# Altium footprint library General.PCBLIB: 226 footprints (part 12 of 15)
Each footprint in its own frame and in the unit in brackets; x right, y up, seen from the top. Pads: shape width x height; smd on the part's side, far side on the other; paste and mask are expansions set on the pad; w line width, h text height; cw(c..) or ccw(c..) is an arc to the next point about the centre after c.
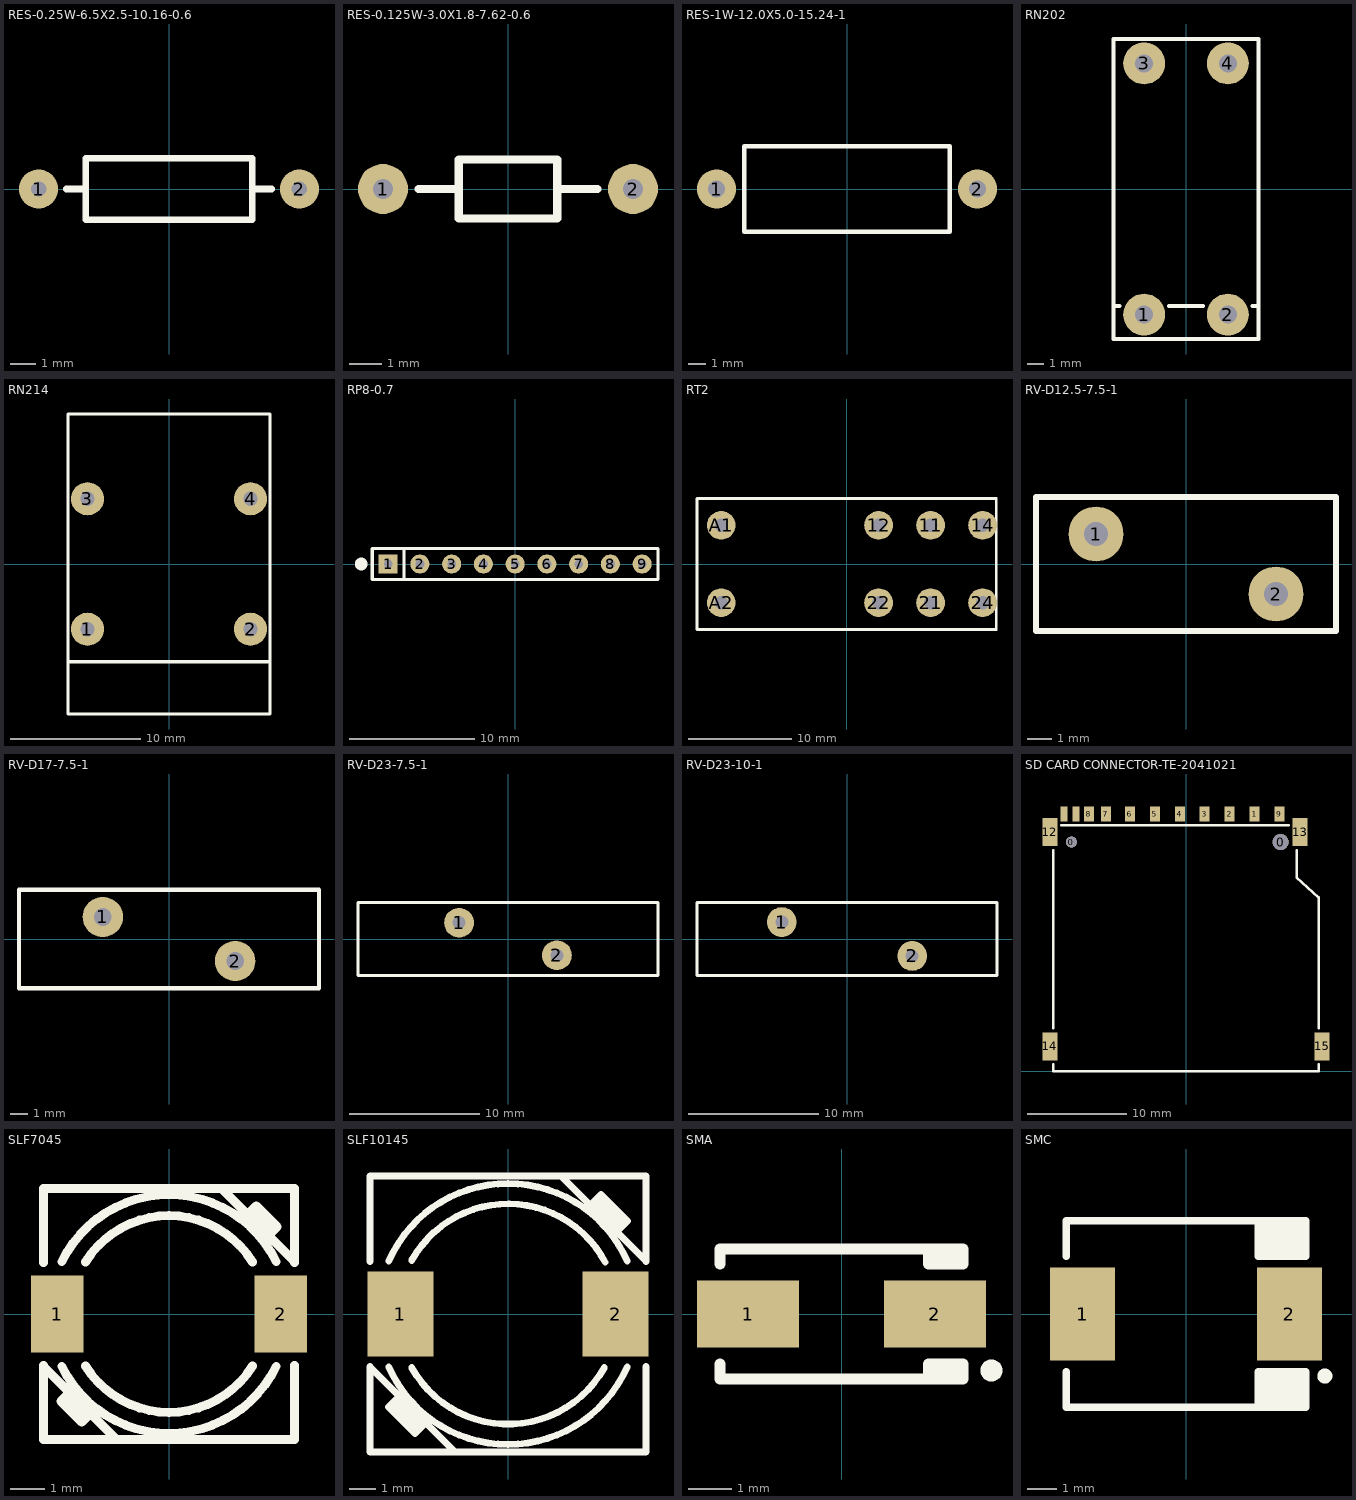
[diagram p11: the footprints below, top view; thin cyan lines are the x and y axes]

## RES-0.25W-6.5X2.5-10.16-0.6 [mil] "Resistor, 0.25W"
height 94.49
pads (2):
  round 60 hole 23.62: 1(-200,0) 2(200,0)
Top Overlay:
  lines w10: -157.48,0 -127.95,0 ; 127.95,0 157.48,0 ; -127.95,-47.24 -127.95,47.24 127.95,47.24 127.95,-47.24 -127.95,-47.24
3D body: height 91.88, standoff -123.62, extent -212.01,-45.47 211.99,45.53

## RES-0.125W-3.0X1.8-7.62-0.6 [mil] "Resistor, 0.125W"
height 70.87
pads (2):
  round 60 hole 23.62: 1(-150,0) 2(150,0)
Top Overlay:
  lines w10: -107.48,0 -59.06,0 ; 59.06,0 107.48,0 ; -59.06,-35.43 59.06,-35.43 59.06,35.43 -59.06,35.43 -59.06,-35.43
3D body: height 71.65, standoff -160.63, extent -157.87,-35.43 157.09,35.43

## RES-1W-12.0X5.0-15.24-1 [mil] "Resistor, 1W"
height 196.85
pads (2):
  round 90 hole 39.37: 1(-300,0) 2(300,0)
Top Overlay:
  lines w10: -236.22,-98.43 236.22,-98.43 236.22,98.43 -236.22,98.43 -236.22,-98.43
3D body: height 196.85, standoff -118.11, extent -313.78,-98.43 313.78,98.43

## RN202 [mm] "SCHAFFNER Chock"
height 13.5
pads (4):
  round 2.54 hole 1.1: 1(-2.54,-7.62) 2(2.54,-7.62) 3(-2.54,7.62) 4(2.54,7.62)
Top Overlay:
  lines w0.254: -4.4,-7.1 -4.04,-7.1 ; -1.04,-7.1 1.04,-7.1 ; 4.04,-7.1 4.4,-7.1 ; -4.4,-9.1 -4.4,9.1 4.4,9.1 4.4,-9.1 -4.4,-9.1
3D body: height 23.81, standoff 0, extent -4.4,-9.1 4.4,9.1

## RN214 [mm] "SCHAFFNER Chock"
height 25
pads (4):
  round 2.54 hole 1.1: 1(-6.25,-5) 2(6.25,-5) 3(-6.25,5) 4(6.25,5)
Top Overlay:
  lines w0.254: -7.75,-7.5 7.75,-7.5 ; -7.75,-11.5 7.75,-11.5 7.75,11.5 -7.75,11.5 -7.75,-11.5
3D body: height 25, standoff 0, extent -7.75,-11.5 7.75,11.5

## RP8-0.7 [mil] "Resistor Pack 8"
height 236.22
pads (9):
  rect 60x60 hole 27.56: 1(-400,0)
  round 60 hole 27.56: 2(-300,0) 3(-200,0) 4(-100,0) 5(0,0) 6(100,0) 7(200,0) 8(300,0) 9(400,0)
Top Overlay:
  circle w20: c-485,0 r10
  lines w10: -350,-49.21 -350,49.21 ; -450,-49.21 -450,49.21 450,49.21 450,-49.21 -450,-49.21
3D body: height 198.82, standoff -135.83, extent -442.91,-24.61 442.91,24.61

## RT2 [mm] "Relay, TE"
height 16.2
pads (8):
  round 2.794 hole 1.3: 11(8.15,3.75) 12(3.11,3.75) 14(13.19,3.75) 21(8.15,-3.75) 22(3.11,-3.75) 24(13.19,-3.75) A1(-12.15,3.75) A2(-12.15,-3.75)
Top Overlay:
  lines w0.254: -14.5,-6.35 14.5,-6.35 14.5,6.35 -14.5,6.35 -14.5,-6.35
3D body: height 15.5, standoff -4, extent -14.5,-6.25 14.5,6.25

## RV-D12.5-7.5-1 [mm] "Varistor, 10mm"
height 16
pads (2):
  round 2.286 hole 1: 1(-3.75,1.25) 2(3.75,-1.25)
Top Overlay:
  lines w0.254: -6.25,-2.8 -6.25,2.8 6.25,2.8 6.25,-2.8 -6.25,-2.8
3D body: height 16, standoff -3, extent -6.25,-2.8 6.25,2.8

## RV-D17-7.5-1 [mm] "Varistor, 14mm"
height 20
pads (2):
  round 2.286 hole 1: 1(-3.75,1.25) 2(3.75,-1.25)
Top Overlay:
  lines w0.254: -8.5,-2.8 8.5,-2.8 8.5,2.8 -8.5,2.8 -8.5,-2.8
3D body: height 20, standoff -3, extent -8.5,-2.8 8.499,2.8

## RV-D23-7.5-1 [mm] "Varistor, 20mm"
height 26.5
pads (2):
  round 2.286 hole 1: 1(-3.75,1.25) 2(3.75,-1.25)
Top Overlay:
  lines w0.254: -11.5,-2.8 -11.5,2.8 11.5,2.8 11.5,-2.8 -11.5,-2.8
3D body: height 26.5, standoff -3, extent -11.5,-2.8 11.5,2.8

## RV-D23-10-1 [mm] "Varistor, 20mm"
height 26.5
pads (2):
  round 2.286 hole 1: 1(-5,1.3) 2(5,-1.3)
Top Overlay:
  lines w0.254: -11.5,-2.8 11.5,-2.8 11.5,2.8 -11.5,2.8 -11.5,-2.8
3D body: height 24.7, standoff -2.79, extent -10.756,-2.898 10.744,2.9

## SD CARD CONNECTOR-TE-2041021 [mm] "SD Card Connector, TE, 2041021"
height 3.3
pads (17):
  round 1.1 hole 1.1 unplated: 0(-11.5,23)
  round 1.6 hole 1.6 unplated: 0(9.5,23)
  rect 1x1.5 smd: 1(6.875,25.8) 2(4.375,25.8) 3(1.875,25.8) 4(-0.625,25.8) 5(-3.125,25.8) 6(-5.625,25.8) 7(-8.05,25.8) 8(-9.75,25.8) 9(9.375,25.8)
  rect 0.7x1.5 smd: 10(-11.05,25.8) 11(-12.25,25.8)
  rect 1.5x2.8 smd: 12(-13.65,24) 13(11.45,24) 14(-13.65,2.5) 15(13.65,2.5)
Top Overlay:
  lines w0.254: -13.3,0.7 -13.3,0 13.3,0 13.3,0.7 ; -13.3,4.3 -13.3,22.2 ; -12.5,24.67 10.3,24.67 ; 11.1,22.2 11.1,19.44 13.3,17.44 13.3,4.3
3D body: height 3.3, standoff -0.6, extent -14.025,0 13.95,26.25

## SLF7045 [mm] "TDK, Inductor, SMD, SLF7045"
height 4.5
pads (2):
  rect 1.5x2.2 smd: 1(-3.2,0) 2(3.2,0)
Top Overlay:
  lines w0.254: -3.6,-1.5 -1.5,-3.6 ; -3.6,-1.48 -3.6,-3.6 3.6,-3.6 3.6,-1.48 ; -3.6,1.48 -3.6,3.6 3.6,3.6 3.6,1.48 ; -3.074,-1.499 ccw(c0,0) 3.074,-1.499 ; -3.074,1.499 cw(c0,0) 3.074,1.499 ; -3,-2.4 -2.4,-3 ; -2.8,-2.2 -3.1,-2.5 -2.5,-3.1 -2.2,-2.8 ; -2.391,-1.494 ccw(c0,0) 2.391,-1.494 ; -2.391,1.494 cw(c0,0) 2.391,1.494 ; 1.5,3.6 3.6,1.5 ; 2.2,2.8 2.5,3.1 3.1,2.5 2.8,2.2 ; 2.4,3 3,2.4
3D body: height 4.5, standoff -0.03, extent -3.525,-3.5 3.525,3.5

## SLF10145 [mm] "TDK, Inductor, SMD, SLF10145"
height 4.5
pads (2):
  rect 2.5x3.2 smd: 1(-4.05,0) 2(4.05,0)
Top Overlay:
  lines w0.254: -5.2,-2 -2,-5.2 ; -5.2,-1.98 -5.2,-5.2 5.2,-5.2 5.2,-1.98 ; -5.2,1.98 -5.2,5.2 5.2,5.2 5.2,1.98 ; -4.49,-1.999 ccw(c0,0) 4.49,-1.999 ; -4.49,1.999 cw(c0,0) 4.49,1.999 ; -4.4,-3.4 -3.4,-4.4 ; -4.3,-3.3 -3.3,-4.3 ; -4.2,-3.2 -3.2,-4.2 ; -4,-3 -4.5,-3.5 -3.5,-4.5 -3,-4 ; -3.63,-2.012 ccw(c0,0) 3.63,-2.012 ; -3.63,2.012 cw(c0,0) 3.664,1.948 ; 2,5.2 5.2,2 ; 3,4 3.5,4.5 4.5,3.5 4,3 ; 3.2,4.2 4.2,3.2 ; 3.3,4.3 4.3,3.3 ; 3.4,4.4 4.4,3.4
3D body: height 4.5, standoff -0.03, extent -5.025,-5 5.025,5

## SMA [mm] "DO-214AC"
height 2.03
pads (2):
  rect 2.35x1.55 smd: 1(-2.15,0) 2(2.15,0)
Top Overlay:
  circle w0.254: c3.45,-1.3 r0.127
  lines w0.254: -2.8,-1.15 -2.8,-1.5 2.8,-1.5 2.8,-1.15 2,-1.15 2,-1.5 ; -2.8,1.15 -2.8,1.5 2.8,1.5 2.8,1.15 2,1.15 2,1.5 ; 2.2,-1.5 2.2,-1.15 ; 2.2,1.15 2.2,1.5 ; 2.4,-1.5 2.4,-1.15 ; 2.4,1.15 2.4,1.5 ; 2.6,-1.5 2.6,-1.15 ; 2.6,1.15 2.6,1.5
3D body: height 2.64, standoff 0.02, extent -2.6,-1.3 2.6,1.3

## SMC [mm] "DO-214AB"
height 2.65
pads (2):
  rect 2.2x3.15 smd: 1(-3.5,0) 2(3.5,0)
Top Overlay:
  circle w0.254: c4.7,-2.1 r0.127
  lines w0.254: -4.05,-1.95 -4.05,-3.15 4.05,-3.15 4.05,-1.95 2.45,-1.95 2.45,-3.15 ; -4.05,1.95 -4.05,3.15 4.05,3.15 4.05,1.95 2.45,1.95 2.45,3.15 ; 2.65,-3.15 2.65,-1.95 ; 2.65,1.95 2.65,3.15 ; 2.85,-3.15 2.85,-1.95 ; 2.85,1.95 2.85,3.15 ; 3.05,-3.15 3.05,-1.95 ; 3.05,1.95 3.05,3.15 ; 3.25,-3.15 3.25,-1.95 ; 3.25,1.95 3.25,3.15 ; 3.45,-3.15 3.45,-1.95 ; 3.45,1.95 3.45,3.15 ; 3.65,-3.15 3.65,-1.95 ; 3.65,1.95 3.65,3.15 ; 3.85,-3.15 3.85,-1.95 ; 3.85,1.95 3.85,3.15
3D body: height 2.67, standoff 0.02, extent -3.95,-2.95 3.95,2.95